# Altium footprint library Разъемы.PcbLib: 291 footprints (part 17 of 19)
Each footprint in its own frame and in the unit in brackets; x right, y up, seen from the top. Pads: shape width x height; smd on the part's side, far side on the other; paste and mask are expansions set on the pad; w line width, h text height; cw(c..) or ccw(c..) is an arc to the next point about the centre after c.
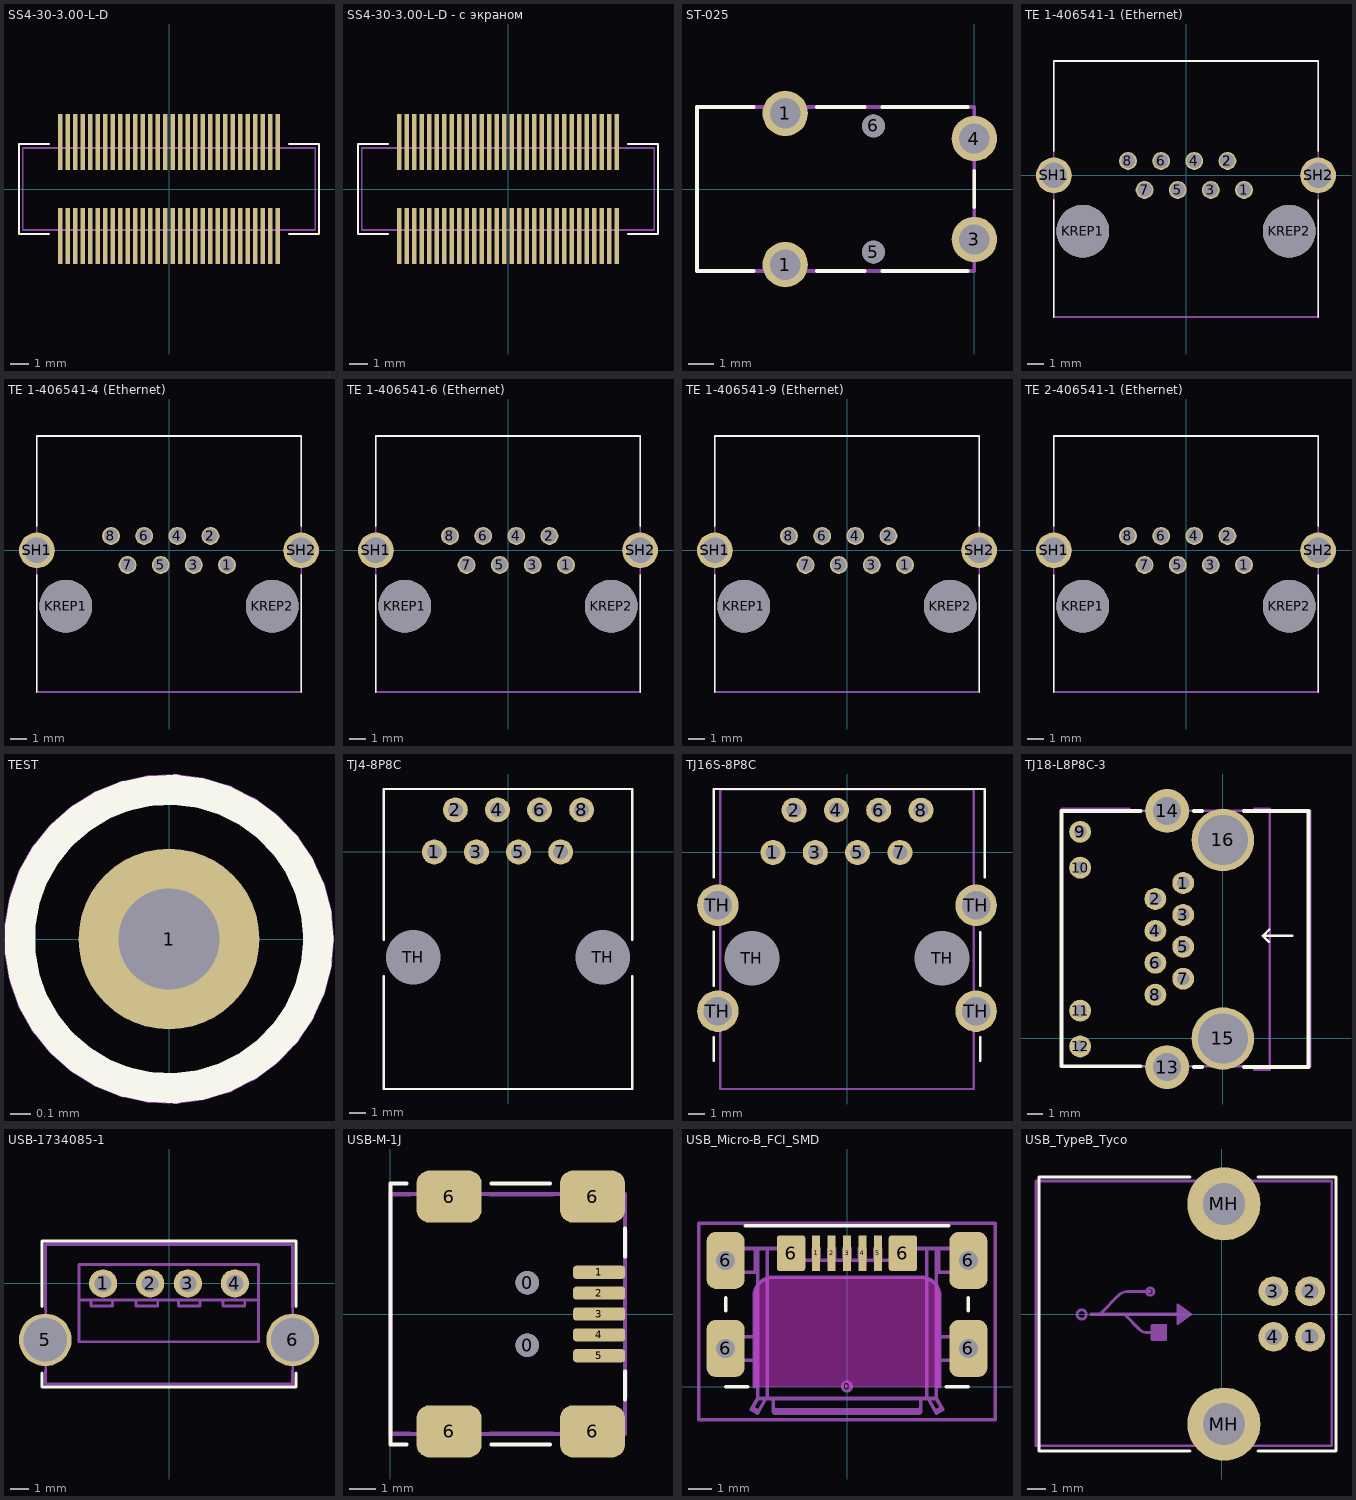
[diagram p16: the footprints below, top view; thin cyan lines are the x and y axes]

## SS4-30-3.00-L-D [mm] "SS4-30-3.00-L-D"
height 3.5
pads (60):
  rect 0.25x3 smd: 1(5.8,2.5) 2(5.8,-2.5) 3(5.4,2.5) 4(5.4,-2.5) 5(5,2.5) 6(5,-2.5) 7(4.6,2.5) 8(4.6,-2.5) 9(4.2,2.5) 10(4.2,-2.5) 11(3.8,2.5) 12(3.8,-2.5) 13(3.4,2.5) 14(3.4,-2.5) 15(3,2.5) 16(3,-2.5) 17(2.6,2.5) 18(2.6,-2.5) 19(2.2,2.5) 20(2.2,-2.5) 21(1.8,2.5) 22(1.8,-2.5) 23(1.4,2.5) 24(1.4,-2.5) 25(1,2.5) 26(1,-2.5) 27(0.6,2.5) 28(0.6,-2.5) 29(0.2,2.5) 30(0.2,-2.5) 31(-0.2,2.5) 32(-0.2,-2.5) 33(-0.6,2.5) 34(-0.6,-2.5) 35(-1,2.5) 36(-1,-2.5) 37(-1.4,2.5) 38(-1.4,-2.5) 39(-1.8,2.5) 40(-1.8,-2.5) 41(-2.2,2.5) 42(-2.2,-2.5) 43(-2.6,2.5) 44(-2.6,-2.5) 45(-3,2.5) 46(-3,-2.5) 47(-3.4,2.5) 48(-3.4,-2.5) 49(-3.8,2.5) 50(-3.8,-2.5) 51(-4.2,2.5) 52(-4.2,-2.5) 53(-4.6,2.5) 54(-4.6,-2.5) 55(-5,2.5) 56(-5,-2.5) 57(-5.4,2.5) 58(-5.4,-2.5) 59(-5.8,2.5) 60(-5.8,-2.5)
Top Overlay:
  lines w0.1: -6.4,-2.4 -8,-2.4 -8,2.4 -6.4,2.4 ; 6.4,-2.4 8,-2.4 8,2.4 6.4,2.4
Mechanical 1:
  lines w0.1: -7.8,-2.18 -7.8,2.18 7.8,2.18 7.8,-2.18 -7.8,-2.18
3D body "SS4_30_3_00_L_D_K_TR.STEP": height 3.38, standoff -0.12, extent -7.76,-2.5 7.78,2.5

## SS4-30-3.00-L-D - с экраном [mm] "SS4-30-3.00-L-D"
height 7.38
pads (60):
  rect 0.25x3 smd: 1(5.8,2.5) 2(5.8,-2.5) 3(5.4,2.5) 4(5.4,-2.5) 5(5,2.5) 6(5,-2.5) 7(4.6,2.5) 8(4.6,-2.5) 9(4.2,2.5) 10(4.2,-2.5) 11(3.8,2.5) 12(3.8,-2.5) 13(3.4,2.5) 14(3.4,-2.5) 15(3,2.5) 16(3,-2.5) 17(2.6,2.5) 18(2.6,-2.5) 19(2.2,2.5) 20(2.2,-2.5) 21(1.8,2.5) 22(1.8,-2.5) 23(1.4,2.5) 24(1.4,-2.5) 25(1,2.5) 26(1,-2.5) 27(0.6,2.5) 28(0.6,-2.5) 29(0.2,2.5) 30(0.2,-2.5) 31(-0.2,2.5) 32(-0.2,-2.5) 33(-0.6,2.5) 34(-0.6,-2.5) 35(-1,2.5) 36(-1,-2.5) 37(-1.4,2.5) 38(-1.4,-2.5) 39(-1.8,2.5) 40(-1.8,-2.5) 41(-2.2,2.5) 42(-2.2,-2.5) 43(-2.6,2.5) 44(-2.6,-2.5) 45(-3,2.5) 46(-3,-2.5) 47(-3.4,2.5) 48(-3.4,-2.5) 49(-3.8,2.5) 50(-3.8,-2.5) 51(-4.2,2.5) 52(-4.2,-2.5) 53(-4.6,2.5) 54(-4.6,-2.5) 55(-5,2.5) 56(-5,-2.5) 57(-5.4,2.5) 58(-5.4,-2.5) 59(-5.8,2.5) 60(-5.8,-2.5)
Top Overlay:
  lines w0.1: -6.4,-2.4 -8,-2.4 -8,2.4 -6.4,2.4 ; 6.4,-2.4 8,-2.4 8,2.4 6.4,2.4
Mechanical 1:
  lines w0.1: -7.8,-2.18 -7.8,2.18 7.8,2.18 7.8,-2.18 -7.8,-2.18
3D body "SS4-30 с установленным экраном.STEP": height 6, standoff -0.12, extent -11.66,-8.235 7.84,8.265

## ST-025 [mm] "3.5 mm PHONE JACKS (DIP Type)"
height 5
pads (6):
  round 1.8 hole 1.2: 1(-7.5,-3) 1(-7.5,3) 3(0,-2) 4(0,2)
  round 0.9 hole 0.9: 5(-4,-2.5) 6(-4,2.5)
Top Overlay:
  lines w0.15: -8.752,-3.25 -11,-3.25 -11,3.25 -8.752,3.25 ; -6.248,-3.25 -4.348,-3.25 ; -6.248,3.25 -4.348,3.25 ; -3.652,-3.25 -0.259,-3.25 ; -3.652,3.25 -0.259,3.25 ; 0,-0.723 0,0.723
Mechanical 29:
  lines w0.15: -8.825,-3.25 -11,-3.25 ; -8.825,3.25 -11,3.25 ; -6.125,-3.25 0,-3.25 ; -6.125,3.25 0,3.25 ; 0,-0.775 0,0 0,0.775 ; -11,-3.25 -11,3.25 ; -11,-3.25 0,-3.25 ; -11,-3.25 -11,3.25 ; -11,3.25 0,3.25 ; 0,-3.25 0,3.25

## TE 1-406541-1 (Ethernet) [mm]
height 13.97
pads (13):
  round 1.1 hole 0.89: 1(3.57,-0.89) 2(2.55,0.89) 2(2.55,0.89) 3(1.53,-0.89) 4(0.51,0.89) 5(-0.51,-0.89) 6(-1.53,0.89) 7(-2.55,-0.89) 8(-3.57,0.89)
  round 3.25 hole 3.25 unplated: KREP1(-6.35,-3.43) KREP2(6.35,-3.43)
  round 2.2 hole 1.57: SH1(-8.13,0) SH2(8.13,0)
Top Overlay:
  lines w0.1: -8.13,-8.71 -8.13,-1.5 ; -8.13,1.5 -8.13,7.04 8.13,7.04 8.13,1.5 ; 8.13,-8.71 8.13,-1.5
Mechanical 1:
  lines w0.1: -8.13,-8.71 -8.13,7.04 8.13,7.04 8.13,-8.71 -8.13,-8.71
3D body "TE 1-406541-1 (Ethernet).STEP": height 15.75, standoff -4.13, extent -9.32,-8.7 9.32,7.05

## TE 1-406541-4 (Ethernet) [mm]
height 13.97
pads (13):
  round 1.1 hole 0.89: 1(3.57,-0.89) 2(2.55,0.89) 2(2.55,0.89) 3(1.53,-0.89) 4(0.51,0.89) 5(-0.51,-0.89) 6(-1.53,0.89) 7(-2.55,-0.89) 8(-3.57,0.89)
  round 3.25 hole 3.25 unplated: KREP1(-6.35,-3.43) KREP2(6.35,-3.43)
  round 2.2 hole 1.57: SH1(-8.13,0) SH2(8.13,0)
Top Overlay:
  lines w0.1: -8.13,-8.71 -8.13,-1.5 ; -8.13,1.5 -8.13,7.04 8.13,7.04 8.13,1.5 ; 8.13,-8.71 8.13,-1.5
Mechanical 1:
  lines w0.1: -8.13,-8.71 -8.13,7.04 8.13,7.04 8.13,-8.71 -8.13,-8.71
3D body "TE 1-406541-4 (Ethernet).STEP": height 15.75, standoff -4.13, extent -9.32,-8.7 9.32,7.05

## TE 1-406541-6 (Ethernet) [mm]
height 13.97
pads (13):
  round 1.1 hole 0.89: 1(3.57,-0.89) 2(2.55,0.89) 2(2.55,0.89) 3(1.53,-0.89) 4(0.51,0.89) 5(-0.51,-0.89) 6(-1.53,0.89) 7(-2.55,-0.89) 8(-3.57,0.89)
  round 3.25 hole 3.25 unplated: KREP1(-6.35,-3.43) KREP2(6.35,-3.43)
  round 2.2 hole 1.57: SH1(-8.13,0) SH2(8.13,0)
Top Overlay:
  lines w0.1: -8.13,-8.71 -8.13,-1.5 ; -8.13,1.5 -8.13,7.04 8.13,7.04 8.13,1.5 ; 8.13,-8.71 8.13,-1.5
Mechanical 1:
  lines w0.1: -8.13,-8.71 8.13,-8.71 8.13,7.04 -8.13,7.04 -8.13,-8.71
3D body "TE 1-406541-6 (Ethernet).STEP": height 15.75, standoff -4.13, extent -9.32,-8.7 9.32,7.05

## TE 1-406541-9 (Ethernet) [mm]
height 13.97
pads (13):
  round 1.1 hole 0.89: 1(3.57,-0.89) 2(2.55,0.89) 2(2.55,0.89) 3(1.53,-0.89) 4(0.51,0.89) 5(-0.51,-0.89) 6(-1.53,0.89) 7(-2.55,-0.89) 8(-3.57,0.89)
  round 3.25 hole 3.25 unplated: KREP1(-6.35,-3.43) KREP2(6.35,-3.43)
  round 2.2 hole 1.57: SH1(-8.13,0) SH2(8.13,0)
Top Overlay:
  lines w0.1: -8.13,-8.71 -8.13,-1.5 ; -8.13,1.5 -8.13,7.04 8.13,7.04 8.13,1.5 ; 8.13,-8.71 8.13,-1.5
Mechanical 1:
  lines w0.1: -8.13,-8.71 8.13,-8.71 8.13,7.04 -8.13,7.04 -8.13,-8.71
3D body "TE 1-406541-9 (Ethernet).STEP": height 15.75, standoff -4.13, extent -9.32,-8.7 9.32,7.05

## TE 2-406541-1 (Ethernet) [mm]
height 13.97
pads (13):
  round 1.1 hole 0.89: 1(3.57,-0.89) 2(2.55,0.89) 2(2.55,0.89) 3(1.53,-0.89) 4(0.51,0.89) 5(-0.51,-0.89) 6(-1.53,0.89) 7(-2.55,-0.89) 8(-3.57,0.89)
  round 3.25 hole 3.25 unplated: KREP1(-6.35,-3.43) KREP2(6.35,-3.43)
  round 2.2 hole 1.57: SH1(-8.13,0) SH2(8.13,0)
Top Overlay:
  lines w0.1: -8.13,-8.71 -8.13,-1.5 ; -8.13,1.5 -8.13,7.04 8.13,7.04 8.13,1.5 ; 8.13,-8.71 8.13,-1.5
Mechanical 1:
  lines w0.1: -8.13,-8.71 8.13,-8.71 8.13,7.04 -8.13,7.04 -8.13,-8.71
3D body "TE 2-406541-1 (Ethernet).STEP": height 15.75, standoff -4.13, extent -8.63,-8.7 8.63,7.05

## TEST [mm]
pads (1):
  round 0.9 hole 0.5 paste-2539.97: 1(0,0)
Top Overlay:
  circle w0.15: c0,0 r0.742
Top Courtyard:
  circle w0.15: c0,0 r0.3
Mechanical 29:
  circle w0.15: c0,0 r0.746

## TJ4-8P8C [mm]
height 11.5
pads (10):
  round 1.5 hole 0.9: 1(-4.445,0) 2(-3.175,2.54) 3(-1.905,0) 4(-0.635,2.54) 5(0.635,0) 6(1.905,2.54) 7(3.175,0) 8(4.445,2.54)
  round 1.5 hole 3.3 unplated: TH(-5.715,-6.35) TH(5.715,-6.35)
Top Overlay:
  lines w0.15: -7.5,-7.5 -7.5,-14.3 7.5,-14.3 7.5,-7.5 ; -7.5,-5.3 -7.5,3.8 0,3.8 7.5,3.8 7.5,-5.3
Top Designator:
  text ".Designator" at -4.019,-5.517 h0.8
3D body "432028104.stp": height 11.58, standoff -3.56, extent -7.64,-14.317 7.6,3.717

## TJ16S-8P8C [mm]
height 13.6
pads (14):
  round 1.5 hole 0.9: 1(-4.445,0) 2(-3.175,2.54) 3(-1.905,0) 4(-0.635,2.54) 5(0.635,0) 6(1.905,2.54) 7(3.175,0) 8(4.445,2.54)
  round 2.5 hole 1.7: TH(-7.75,-9.525) TH(-7.75,-3.175) TH(7.75,-9.525) TH(7.75,-3.175)
  round 1.5 hole 3.3 unplated: TH(-5.715,-6.35) TH(5.715,-6.35)
Top Overlay:
  lines w0.15: -8,-12.5 -8,-11.1 ; -8,-8 -8,-4.75 ; -8,-1.5 -8,3.81 0,3.81 8.255,3.81 8.255,-1.5 ; 8,-12.5 8,-11.1 ; 8,-8 8,-4.8
Top Courtyard:
  lines w0.15: -7.6,-14.2 -7.6,3.8 7.6,3.8 7.6,-14.2 -7.6,-14.2
Top Designator:
  text ".Designator" at -3.999,-5.462 h0.8
3D body "432028104.stp": height 11.58, standoff -3.56, extent -7.62,-14.2 7.62,3.834

## TJ18-L8P8C-3 [mm]
pads (16):
  round 1.4 hole 0.8: 1(-2.54,9.94) 2(-4.32,8.92) 3(-2.54,7.9) 4(-4.32,6.88) 5(-2.54,5.86) 6(-4.32,4.84) 7(-2.54,3.82) 8(-4.32,2.8) 9(-9.13,13.21) 10(-9.13,10.92) 11(-9.13,1.78) 12(-9.13,-0.51)
  round 2.8 hole 1.8: 13(-3.57,-1.83) 14(-3.57,14.55)
  round 4 hole 3.2: 15(0,0) 16(0,12.69)
Top Overlay:
  lines w0.15: 2.939,6.173 2.552,6.56 ; 2.956,6.964 2.552,6.56 ; 4.427,6.56 3.295,6.56 2.905,6.56 2.552,6.56
  lines w0.254: -5.275,-1.775 -10.325,-1.775 -10.325,14.55 -5.275,14.55 ; -1.84,-1.83 -1.325,-1.83 ; -1.84,14.55 -1.325,14.55 ; 1.35,-1.83 5.475,-1.83 5.475,14.55 1.35,14.55
Top Designator:
  text ".Designator" at -6.4,6.093 h0.8
Mechanical 29:
  lines w0.15: -6,-1.775 -10.325,-1.775 ; -6,14.7 -10.325,14.7 -10.325,-1.775 ; 2,-2 3,-2 3,14.7 2,14.7 ; -10.325,-1.775 5.6,-1.775 5.6,14.55 -10.325,14.55 -10.325,-1.775
  text ".Designator" at -7,5.7 h1
3D body "AMPHENOL_RJHSE-5381.stp": height 15.14, standoff -3.7, extent -10.503,-2 5.7,14.83

## USB-1734085-1 [mm]
pads (6):
  round 1.5 hole 0.9: 1(-3.5,0) 2(-1,0) 3(1,0) 4(3.5,0)
  round 2.8 hole 2.3: 5(-6.57,-3) 6(6.57,-3)
Top Overlay:
  lines w0.15: -6.75,-4.767 -6.75,-5.5 6.75,-5.5 6.75,-4.767 ; -6.75,-1.233 -6.75,2.25 6.75,2.25 6.75,-1.233
Top Designator:
  text ".Designator" at -3.999,-1.882 h0.8
Mechanical 29:
  lines w0.15: -6.575,-1.325 -6.57,-1.325 -6.57,2.1 6.57,2.1 6.57,-1.275 ; -6.57,-4.625 -6.57,-5.35 6.55,-5.35 6.57,-5.33 6.57,-4.625 ; -4.15,-0.875 -4.15,-1.2 -3,-1.2 -3,-0.875 -2.975,-0.875 ; -1.75,-0.875 -1.75,-1.2 -0.6,-1.2 -0.6,-0.875 ; 0.5,-0.875 0.5,-1.2 1.65,-1.2 1.65,-0.875 ; 2.875,-0.875 2.875,-1.2 4.025,-1.2 4.025,-0.875 ; -4.775,-0.875 4.75,-0.875 ; -4.775,-0.875 -4.775,1 4.75,1 4.75,-0.875 ; -4.775,-0.875 -4.775,-3.1 4.7,-3.1 4.75,-3.1 4.75,-0.875 ; -6.55,-5.35 -6.55,2.075 6.575,2.075 6.575,-5.35 -6.55,-5.35
  text ".Designator" at -4,-4.8 h1
3D body "c-1734085-1-d.STEP": height 13.5, standoff -4.55, extent -7.625,-5.455 7.575,2.225

## USB-M-1J [mm]
height 4
pads (11):
  round 0.9 hole 0.9: 0(5.25,-1.2) 0(5.25,1.2)
  rrect50% 2x0.5 smd: 1(8.001,1.6) 2(8.001,0.8) 3(8.001,0) 4(8.001,-0.8) 5(8.001,-1.6)
  rrect50% 2.5x2 smd: 6(2.25,-4.5) 6(2.25,4.5) 6(7.75,-4.5) 6(7.75,4.5)
Top Overlay:
  lines w0.15: 0.623,-5 0,-5 0,5 0.623,5 ; 3.877,-5 6.123,-5 ; 3.877,5 6.123,5 ; 9,-3.28 9,-2.211 ; 9,2.211 9,3.28
Mechanical 29:
  lines w0.15: 0.762,-4.572 0,-4.572 0,0 0,4.572 0.762,4.572 ; 3.81,-4.572 6.223,-4.572 ; 3.81,4.572 6.223,4.572 ; 9.017,-3.175 9.017,-2.159 ; 9.017,2.159 9.017,3.175 ; 0,-4.6 9,-4.6 9,4.6 0,4.6 0,-4.6

## USB_Micro-B_FCI_SMD [mm]
height 2.286
pads (12):
  round 0.508 on Mech15: 0(0,0)
  rrect20% 0.35x1.5 smd: 1(-1.3,5.6) 2(-0.65,5.6) 3(0,5.6) 4(0.65,5.6) 5(1.3,5.6)
  rrect50% 1.6x2.4 hole 0.8: 6(-5.1,1.6) 6(-5.1,5.3) 6(5.1,1.6) 6(5.1,5.3)
  rrect20% 1.2x1.5 smd: 6(-2.35,5.6) 6(2.35,5.6)
Top Overlay:
  lines w0.15: -5.1,0 -4.5,0 -4.175,0 ; -5.1,3.177 -5.1,3.723 ; -4.275,6.75 4.275,6.75 ; 4.175,0 5.1,0 ; 5.1,3.177 5.1,3.723
Top Solder:
  region: 1.905,4.826 1.905,6.35 -1.905,6.35 -1.905,4.826
Keep-Out Layer:
  board cut-out: -3.9,0 -3.9,3.797 -3.9,3.875 -3.869,4.03 -3.809,4.175 -3.721,4.307 -3.61,4.418 -3.479,4.505 -3.333,4.566 -3.179,4.597 -3.1,4.597 3.1,4.597 3.179,4.597 3.333,4.566 3.479,4.505 3.61,4.418 3.721,4.307 3.809,4.175 3.869,4.03 3.9,3.875 3.9,3.797 3.9,0
Top Designator:
  text ".Designator" at -3.999,-7.59 h0.8
Mechanical 13:
  lines w0.15: -3.49,-0.651 ccw(c-3.75,-0.501) -3.45,-0.5 ; -3.1,-1.031 ccw(c-3.006,-1.024) -3,-1.118 ; -3.1,-0.881 ccw(c-3.006,-0.874) -3,-0.968 ; -2.577,5.8 cw(c-2.577,5.6) -2.443,5.748 ; -2.229,5.553 ccw(c-2.275,5.8) -2.024,5.8 ; -2.007,5.352 ccw(c-1.873,5.5) -1.873,5.3 ; 1.873,5.3 ccw(c1.873,5.5) 2.007,5.352 ; 2.024,5.8 ccw(c2.275,5.8) 2.229,5.553 ; 2.443,5.748 cw(c2.577,5.6) 2.577,5.8 ; 3,-1.118 ccw(c3.006,-1.024) 3.1,-1.031 ; 3,-0.968 ccw(c3.006,-0.874) 3.1,-0.881 ; 3.45,-0.5 ccw(c3.75,-0.501) 3.49,-0.651
Mechanical 15:
  lines w0.15: -3.9,0 -3.9,3.797 cw(c-3.1,3.797) -3.1,4.597 3.1,4.597 cw(c3.1,3.797) 3.9,3.797 3.9,0 ; -6.223,-1.397 -6.223,6.858 6.223,6.858 6.223,-1.397 -6.223,-1.397
Mechanical 29:
  lines w0.15: -4.85,1.1 -4.85,2.1 ; -4.85,4.8 -4.85,5.8 ; -3.97,-0.881 -3.71,-1.031 ; -3.85,1.1 -3.85,2.1 ; -3.85,4.8 -3.85,5.8 ; -3.75,1.1 -5.25,1.1 -5.25,2.1 -3.75,2.1 ; -3.75,4.8 -5.25,4.8 -5.25,5.8 -2.577,5.8 ; -3.75,5.8 -3.75,-0.5 ; -3.49,-0.651 -3.76,-1.118 -4.02,-0.968 -3.75,-0.5 ; -3.35,-0.5 -3.35,5.8 ; -3.1,-1.031 -3.1,-0.5 ; -2.526,5.793 -2.526,5.8 ; -2.443,5.748 -2.007,5.352 ; -1.873,5.3 1.873,5.3 ; -1.425,5.3 -1.425,5.8 -1.175,5.8 -1.175,5.3 ; -0.775,5.3 -0.775,5.8 -0.525,5.8 -0.525,5.3 ; -0.125,5.3 -0.125,5.8 0.125,5.8 0.125,5.3 ; 0.525,5.3 0.525,5.8 0.775,5.8 0.775,5.3 ; 1.175,5.3 1.175,5.8 1.425,5.8 1.425,5.3 ; 2.007,5.352 2.443,5.748 ; 2.526,5.793 2.526,5.8 ; 2.577,5.8 5.25,5.8 5.25,4.8 3.75,4.8 ; 3.1,-1.031 3.1,-0.5 ; 3.35,-0.5 3.35,5.8 ; 3.49,-0.651 3.76,-1.118 4.02,-0.968 3.75,-0.5 ; 3.71,-1.031 3.97,-0.881 ; 3.75,1.1 5.25,1.1 5.25,2.1 3.75,2.1 ; 3.75,5.8 3.75,-0.5 ; 3.85,1.1 3.85,2.1 ; 3.85,4.8 3.85,5.8 ; 4.85,1.1 4.85,2.1 ; 4.85,4.8 4.85,5.8 ; -3.75,-0.5 -3.1,-0.5 ; -3.1,-0.5 3.1,-0.501 ; 3.1,-0.5 3.75,-0.5 ; -3,-1.118 3,-1.118 3,-0.968 -3,-0.968 -3,-1.118
  text ".Designator" at -3,1.7 h1
3D body "Micro USB B-type mid-mount FCI.STEP": height 2.15, standoff -0.92, extent -5.25,-1.118 5.25,5.8
3D body "USB Micro B plug.STEP": height 4.67, standoff -3.53, extent -5.35,-21.579 5.35,2.921

## USB_TypeB_Tyco [mm]
height 11.1
pads (6):
  round 1.626 hole 0.914: 1(4.83,-1.25) 2(4.83,1.25) 3(2.83,1.25) 4(2.83,-1.25)
  round 4 hole 2.3: MH(0.12,-6.02) MH(0.12,6.02)
Top Overlay:
  lines w0.15: -1.74,-7.5 -10,-7.5 -10,7.5 -1.74,7.5 ; 1.98,-7.5 6.25,-7.5 6.25,7.5 1.98,7.5
Top Designator:
  text ".Designator" at -6.046,-0.267 h0.8
Mechanical 29:
  circle w0.15: c-3.91,1.225 r0.2
  circle w0.15: c-7.66,-0.025 r0.254
  region: -1.71,-0.025 -2.41,-0.525 -2.41,0.475
  region: -3.06,-1.4 -3.81,-1.4 -3.81,-0.65 -3.06,-0.65
  lines w0.15: -10.16,7.2 -10.16,-7.2 ; -7.16,-0.025 -2.41,-0.025 ; -7.16,0 -2.41,0 ; -6.613,0.037 -5.613,1.037 cw(c-5.16,0.585) -5.16,1.225 -3.91,1.225 ; -6.613,0.062 -5.613,1.062 ; -5.263,-0.087 -4.513,-0.837 ccw(c-4.06,-0.385) -4.06,-1.025 -3.81,-1.025 ; -5.263,-0.062 -4.513,-0.812 ; -5.16,1.25 -3.91,1.25 ; -4.06,-1 -3.81,-1 ; -2.16,-7.2 -10.16,-7.2 ; 2.34,-7.2 5.74,-7.2 ; -10.16,-7.2 6.015,-7.2 6.015,7.275 -10.16,7.275 -10.16,-7.2 ; -3.81,-1.4 -3.06,-1.4 -3.06,-0.65 -3.81,-0.65 -3.81,-1.4 ; -3.81,-1.375 -3.81,-0.625 -3.06,-0.625 -3.06,-1.375 -3.81,-1.375 ; -2.41,-0.525 -1.71,-0.025 -2.41,0.475 -2.41,-0.525 ; -2.41,-0.5 -1.71,0 -2.41,0.5 -2.41,-0.5
  text ".Designator" at -7.66,3.7 h1
3D body "User Library-JST_UBB-4R-D14T-4D.step": height 11.6, standoff -3.12, extent -10.16,-7.475 6.14,7.425